# Altium footprint library cool_library.PcbLib: 1182 footprints (part 18 of 75)
Each footprint in its own frame and in the unit in brackets; x right, y up, seen from the top. Pads: shape width x height; smd on the part's side, far side on the other; paste and mask are expansions set on the pad; w line width, h text height; cw(c..) or ccw(c..) is an arc to the next point about the centre after c.
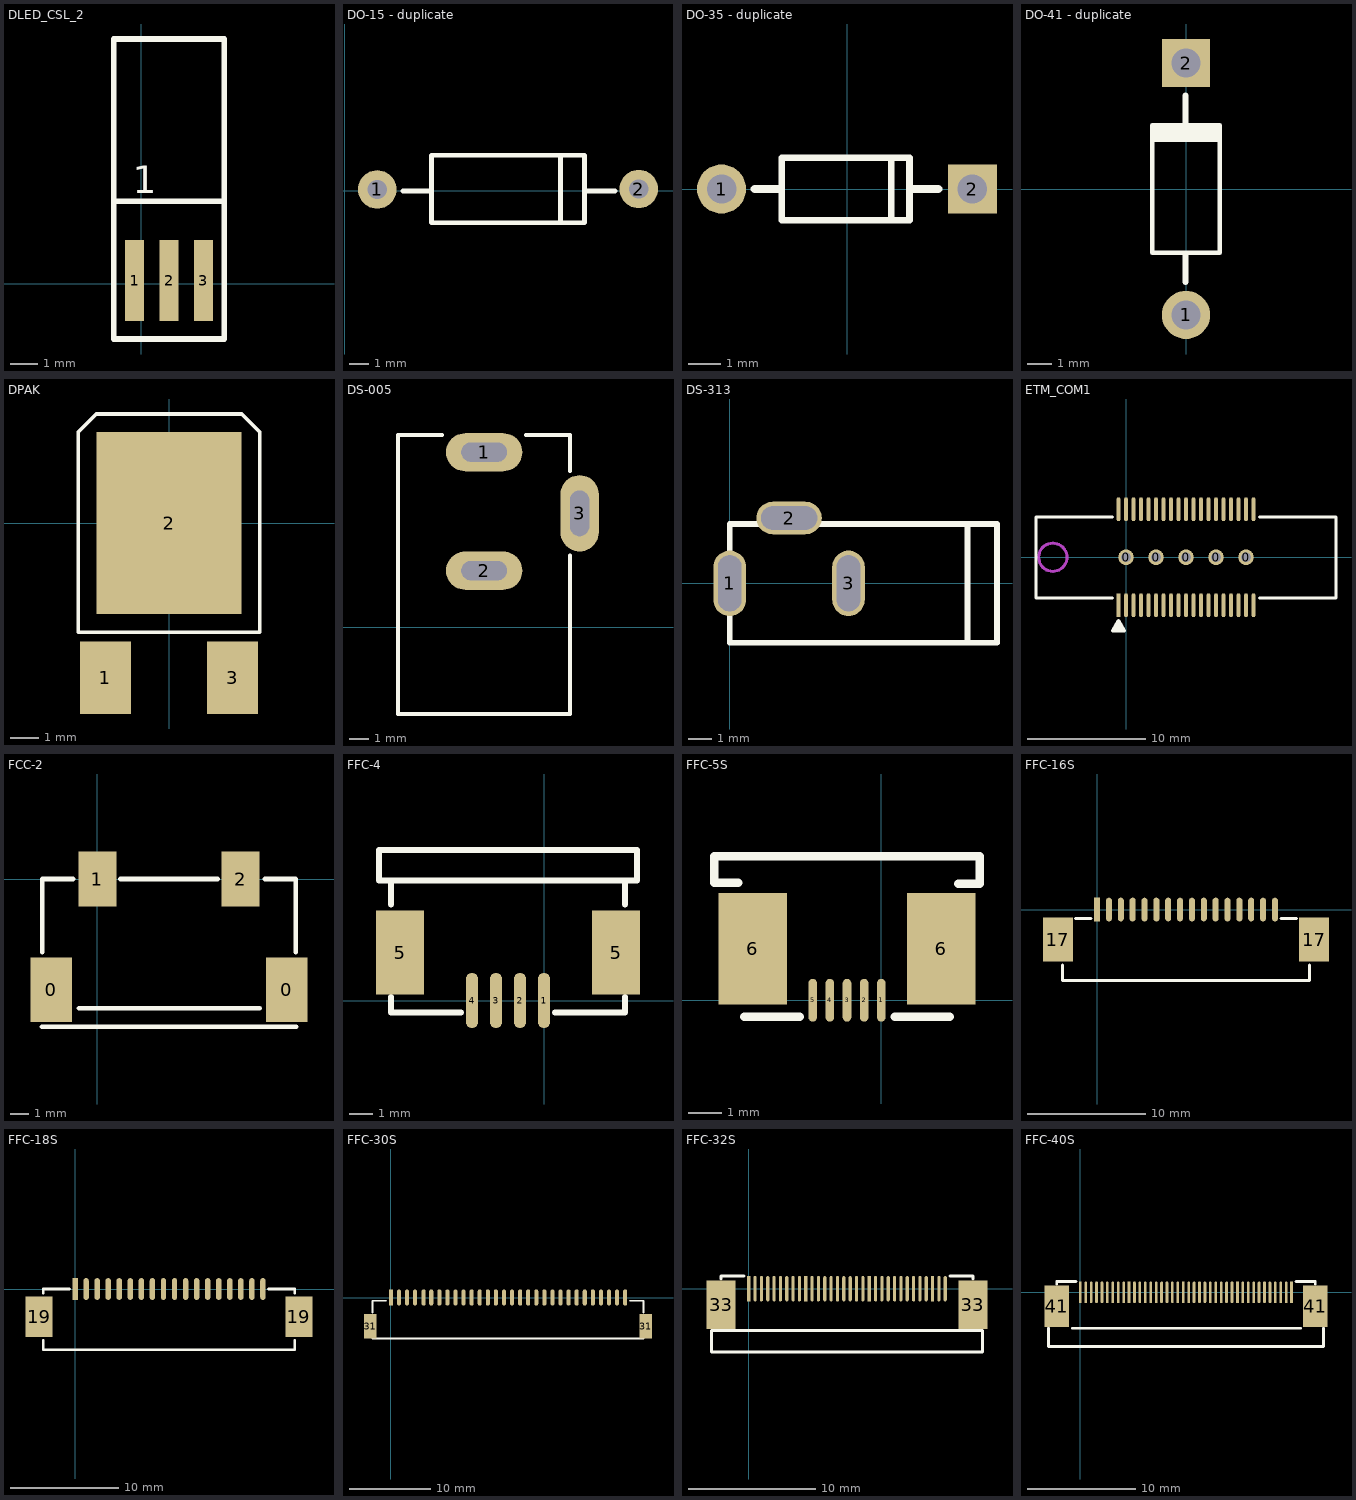
[diagram p17: the footprints below, top view; thin cyan lines are the x and y axes]

## DLED_CSL_2 [mm]
pads (3):
  rect 0.7x3 smd: 1(-0.254,0.127) 2(1.016,0.127) 3(2.286,0.127)
Top Overlay:
  lines w0.203: -1.016,3.048 3.048,3.048 ; -1.016,-2.032 3.048,-2.032 3.048,9.048 -1.016,9.048 -1.016,-2.032
  text "1" at -0.33,3.353 h1.02

## DO-15 - duplicate [mm] "DO-15"
pads (2):
  round 2 hole 1: 1(1.676,0.076) 2(15.265,0.102)
Top Overlay:
  lines w0.254: 3.023,0 4.445,0 ; 11.201,-1.651 11.201,1.854 ; 11.709,-1.651 11.735,-1.651 ; 12.522,0 14.046,0 ; 4.496,-1.651 4.496,1.854 12.446,1.854 12.446,-1.651 4.496,-1.651
3D body: height 4.78, standoff -1, extent 1.245,-1.676 15.705,1.889

## DO-35 - duplicate [mm] "DO-204AH"
pads (2):
  round 1.5 hole 0.9: 1(-3.835,0)
  rect 1.5x1.5 hole 0.9: 2(3.835,0)
Top Overlay:
  lines w0.2: 1.352,-0.95 1.352,0.95 ; 1.899,-0.95 -2.001,-0.95 -2.001,0.95 1.899,0.95 ; 1.911,-0.95 1.911,0.95
  lines w0.254: -2.819,0 -2.026,0 ; 1.956,0 2.794,0
3D body: height 3.33, standoff -1, extent -4.216,-1.321 4.191,1.346

## DO-41 - duplicate [mm]
pads (2):
  round 2 hole 1.2: 1(0,-5.23)
  rect 2x2 hole 1.2: 2(0,5.23)
Top Overlay:
  region: 1.4,1.95 1.4,2.75 -1.4,2.75 -1.4,1.95
  lines w0.2: -1.4,2.65 -1.4,-2.65 1.4,-2.65 1.4,2.65
  lines w0.254: -0.025,-3.858 -0.025,-2.69 ; -0.025,2.466 -0.025,3.889
3D body: height 3.3, standoff -2, extent -1.279,-5.599 1.321,5.461

## DPAK [mil]
pads (3):
  rect 70x100 smd: 1(-87.5,-212.5) 3(87.5,-212.5)
  rect 200x250 smd: 2(0,0)
Top Overlay:
  lines w5: -125,-150 125,-150 125,125 100,150 -100,150 -125,125 -125,-150

## DS-005 [mm]
pads (3):
  oval 4x2 hole 1 slot 2.388 at 0 deg: 1(-10.652,9.173) 2(-10.652,2.973)
  oval 2x4 hole 1 slot 2.388 at 90 deg: 3(-5.652,5.973)
Top Overlay:
  lines w0.2: -12.852,10.073 -15.152,10.073 -15.152,-4.527 -6.152,-4.527 -6.152,3.773 ; -8.452,10.073 -6.152,10.073 -6.152,8.173
Mechanical 2:
  lines w1: -11.902,9.173 -9.402,9.173 ; -11.652,2.973 -9.652,2.973 ; -5.652,4.973 -5.652,6.973

## DS-313 [mm]
pads (3):
  oval 1.4x2.8 hole 1 slot 2.4 at 90 deg: 1(0,0) 3(5.08,0)
  oval 2.8x1.4 hole 1 slot 2.4 at 0 deg: 2(2.54,2.794)
Top Overlay:
  lines w0.254: 10.16,-2.54 10.16,2.54 ; 0,-2.54 0,2.54 11.43,2.54 11.43,-2.54 0,-2.54

## ETM_COM1 [mil]
pads (43):
  round 52 hole 32: 0(0,0) 0(100,0) 0(200,0) 0(300,0) 0(400,0)
  rect 12.5x80 smd: 1(-25,-160)
  oval 12.5x80 smd: 2(-25,160) 3(0,-160) 4(0,160) 5(25,-160) 6(25,160) 7(50,-160) 8(50,160) 9(75,-160) 10(75,160) 11(100,-160) 12(100,160) 13(125,-160) 14(125,160) 15(150,-160) 16(150,160) 17(175,-160) 18(175,160) 19(200,-160) 20(200,160) 21(225,-160) 22(225,160) 23(250,-160) 24(250,160) 25(275,-160) 26(275,160) 27(300,-160) 28(300,160) 29(325,-160) 30(325,160) 31(350,-160) 32(350,160) 33(375,-160) 34(375,160) 35(400,-160) 36(400,160) 37(425,-160) 38(425,160)
Top Overlay:
  rectangle: -35,-245 -15,-220
  rectangle: -40,-245 -5,-235
  lines w10: -45,-135 -300,-135 -300,135 -45,135 ; 445,-135 700,-135 700,135 445,135 ; -45,-245 -25,-210 -5,-245 -45,-245
Keep-Out Layer:
  circle w10: c-244,0 r47.24
Mechanical 1:
  circle w10: c-244,0 r47.24

## FCC-2 [mil]
pads (4):
  rect 90x140 smd: 0(-100,-240) 0(410,-240)
  rect 82x120 smd: 1(0,0) 2(310,0)
Top Overlay:
  lines w10: -120.18,-320 431,-320 ; -120,-159 -120,0 -53,0 ; -40,-280 352,-280 ; 50,0 261,0 ; 363,0 430,0 430,-159

## FFC-4 [mil]
pads (6):
  oval 20x92 smd: 1(0,0) 2(-40,0) 3(-80,0) 4(-120,0)
  rect 80x140 smd: 5(-240,80) 5(120,80)
Top Overlay:
  lines w10: -255,6 -255,-20 -138,-20 ; -255,160 -255,200 ; 18,-20 135,-20 135,6 ; 135,160 135,200 ; -255,200 135,200 ; -255,200 -275,200 -275,251 155,251 155,200 135,200

## FFC-5S [mil]
pads (7):
  oval 10x50 smd: 1(0,0) 2(-20,0) 3(-40,0) 4(-60,0) 5(-80,0)
  rect 80x130 smd: 6(-150,60) 6(70,60)
Top Overlay:
  lines w10: -167,137 -195,137 -195,168 115,168 115,136 90,136 ; -160,-19 -95,-19 ; 16,-19 80,-19

## FFC-16S [mm]
pads (18):
  rect 0.508x2 smd: 1(0,0)
  oval 0.508x2 smd: 2(1,0) 3(2,0) 4(3,0) 5(4,0) 6(5,0) 7(6,0) 8(7,0) 9(8,0) 10(9,0) 11(10,0) 12(11,0) 13(12,0) 14(13,0) 15(14,0) 16(15,0)
  rect 2.5x3.7 smd: 17(-3.302,-2.54) 17(18.302,-2.54)
Top Overlay:
  lines w0.254: -2.921,-4.699 -2.921,-5.969 17.921,-5.969 17.921,-4.699 ; -1.803,-0.737 -0.508,-0.737 ; 15.508,-0.737 16.803,-0.737

## FFC-18S [mm]
pads (20):
  rect 0.5x2 smd: 1(0,0)
  oval 0.5x2 smd: 2(1.016,0) 3(2.032,0) 4(3.048,0) 5(4.064,0) 6(5.08,0) 7(6.096,0) 8(7.112,0) 9(8.128,0) 10(9.144,0) 11(10.16,0) 12(11.176,0) 13(12.192,0) 14(13.208,0) 15(14.224,0) 16(15.24,0) 17(16.256,0) 18(17.272,0)
  rect 2.5x3.7 smd: 19(-3.302,-2.54) 19(20.574,-2.54)
Top Overlay:
  lines w0.254: -2.921,-4.699 -2.921,-5.588 20.193,-5.588 20.193,-4.699 ; -2.921,-0.381 -2.921,0 -0.508,0 ; 17.78,0 20.193,0 20.193,-0.381

## FFC-30S [mm]
pads (32):
  rect 0.5x2 smd: 1(0,0)
  oval 0.5x2 smd: 2(1,0) 3(2,0) 4(3,0) 5(4.064,0) 6(5,0) 7(6,0) 8(7,0) 9(8,0) 10(9,0) 11(10,0) 12(11,0) 13(12,0) 14(13,0) 15(14,0) 16(15,0) 17(16,0) 18(17,0) 19(18,0) 20(19,0) 21(20,0) 22(21,0) 23(22,0) 24(23,0) 25(24,0) 26(25,0) 27(26,0) 28(27,0) 29(28,0) 30(29,0)
  rect 1.524x3.048 smd: 31(-2.54,-3.556) 31(31.54,-3.556)
Top Overlay:
  lines w0.203: -2.272,-5.08 31.272,-5.08 ; -2.272,-1.854 -2.272,-0.38 -0.56,-0.38 ; 29.56,-0.38 31.272,-0.38 31.272,-1.854

## FFC-32S [mm]
pads (34):
  rect 0.25x2 smd: 1(0,0) 10(4.5,0) 20(9.5,0) 30(14.5,0)
  oval 0.25x2 smd: 2(0.5,0) 3(1,0) 4(1.5,0) 5(2,0) 6(2.5,0) 7(3,0) 8(3.5,0) 9(4,0) 11(5,0) 12(5.5,0) 13(6,0) 14(6.5,0) 15(7,0) 16(7.5,0) 17(8,0) 18(8.5,0) 19(9,0) 21(10,0) 22(10.5,0) 23(11,0) 24(11.5,0) 25(12,0) 26(12.5,0) 27(13,0) 28(13.5,0) 29(14,0) 31(15,0) 32(15.5,0)
  rect 2.286x3.81 smd: 33(-2.182,-1.276) 33(17.682,-1.276)
Top Overlay:
  lines w0.254: -2.182,0.756 -2.182,1.01 -0.404,1.01 ; 15.904,1.01 17.682,1.01 17.682,0.756 ; -2.944,-5 18.444,-5 18.444,-3.308 -2.944,-3.308 -2.944,-5

## FFC-40S [mm]
pads (42):
  rect 0.25x2 smd: 1(0,0) 10(4.5,0) 20(9.5,0) 30(14.5,0) 40(19.5,0)
  oval 0.25x2 smd: 2(0.5,0) 3(1,0) 4(1.5,0) 5(2,0) 6(2.5,0) 7(3,0) 8(3.5,0) 9(4,0) 11(5,0) 12(5.5,0) 13(6,0) 14(6.5,0) 15(7,0) 16(7.5,0) 17(8,0) 18(8.5,0) 19(9,0) 21(10,0) 22(10.5,0) 23(11,0) 24(11.5,0) 25(12,0) 26(12.5,0) 27(13,0) 28(13.5,0) 29(14,0) 31(15,0) 32(15.5,0) 33(16,0) 34(16.5,0) 35(17,0) 36(17.5,0) 37(18,0) 38(18.5,0) 39(19,0)
  rect 2.286x3.81 smd: 41(-2.182,-1.276) 41(21.694,-1.276)
Top Overlay:
  lines w0.254: -2.944,-3.308 -2.944,-5 22.456,-5 22.456,-3.308 ; -2.182,0.756 -2.182,1.01 -0.404,1.01 ; -0.75,-3.306 20.35,-3.306 ; 19.916,1.01 21.694,1.01 21.694,0.756